# Altium footprint library THD Passive Components.PcbLib: 72 footprints (part 1 of 5)
Each footprint in its own frame and in the unit in brackets; x right, y up, seen from the top. Pads: shape width x height; smd on the part's side, far side on the other; paste and mask are expansions set on the pad; w line width, h text height; cw(c..) or ccw(c..) is an arc to the next point about the centre after c.
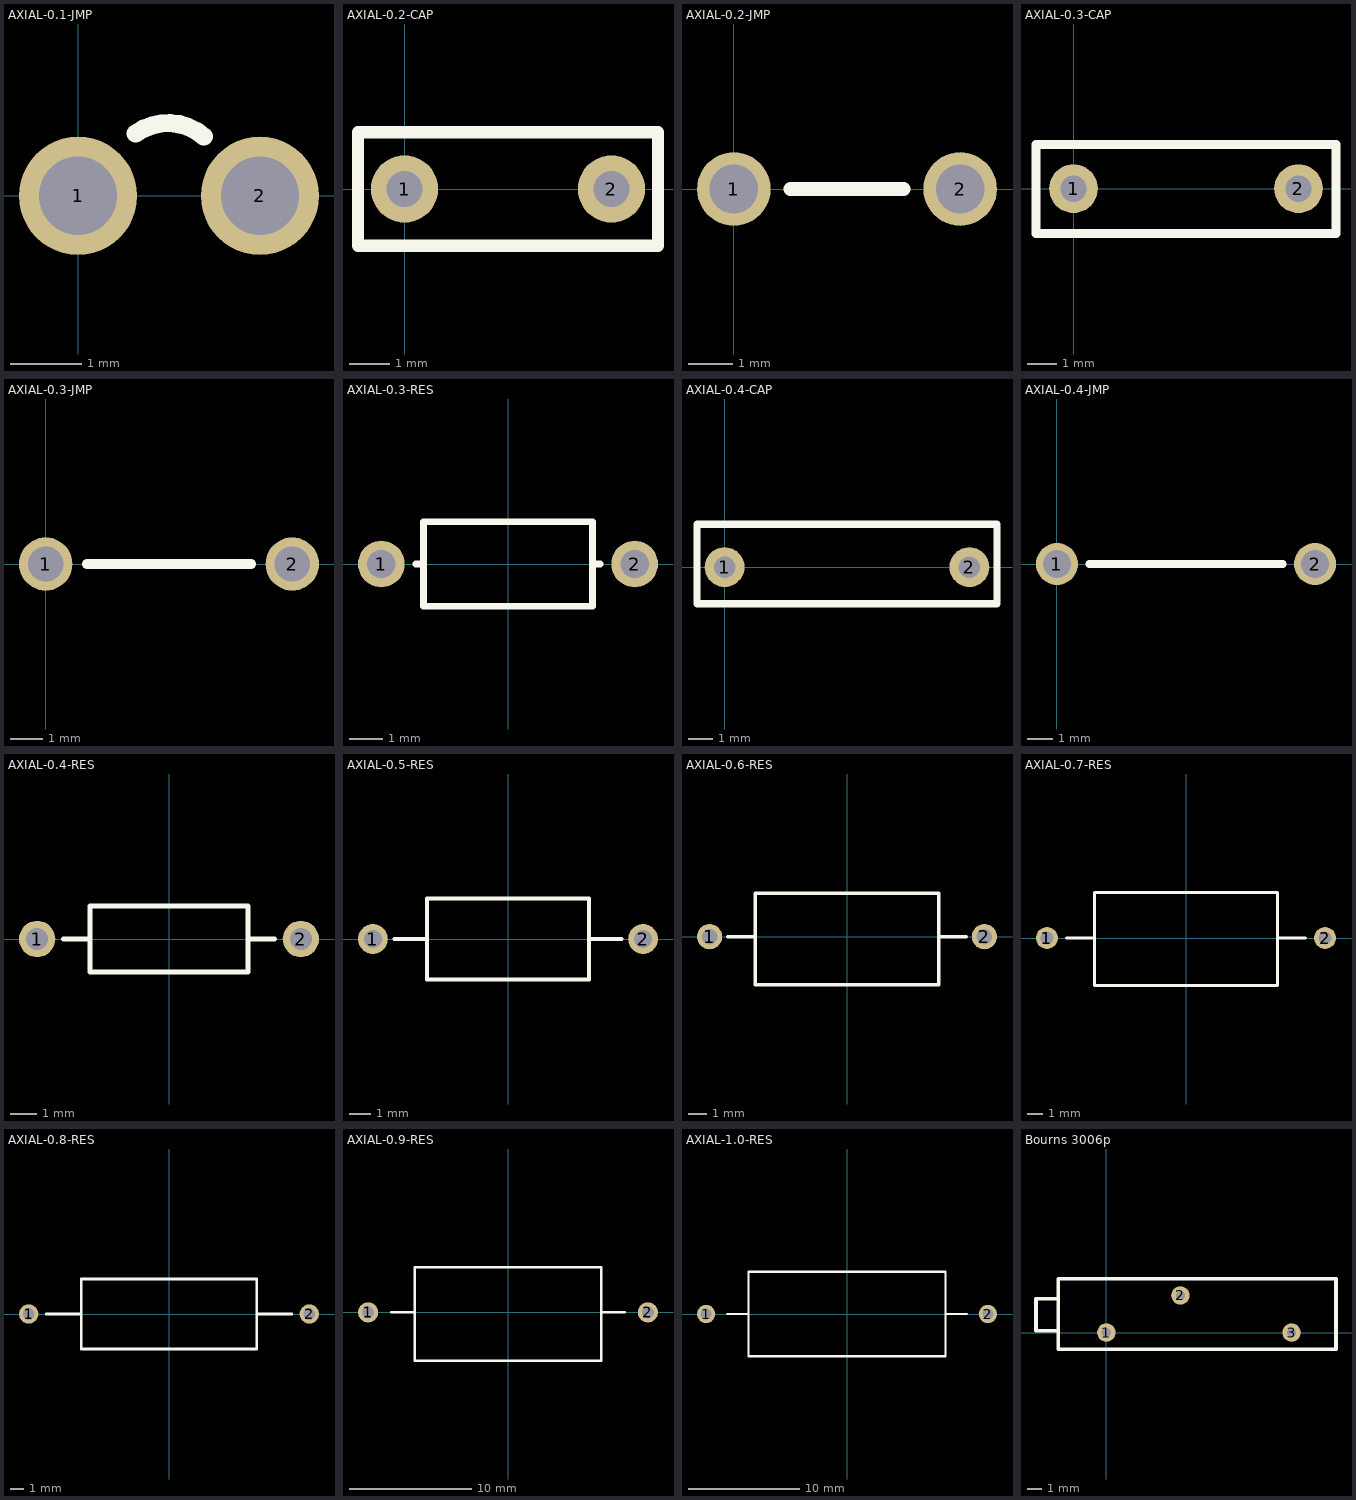
[diagram p0: the footprints below, top view; thin cyan lines are the x and y axes]

## AXIAL-0.1-JMP [mil]
pads (2):
  round 65 hole 43: 1(0,0) 2(100,0)
Top Overlay:
  lines w10: 31.56,34.22 cw(c49.36,9.73) 69.14,32.66
3D body "Jumper-100mil.STEP": height 84.49, standoff -285.33, extent -20.33,-19.68 118.82,19.69

## AXIAL-0.2-CAP [mil]
pads (2):
  round 65 hole 35: 1(0,0) 2(200,0)
Top Overlay:
  lines w12: -45,-55 245,-55 245,55 -45,55 -45,-37.5 -45,-55
3D body "THD Cap Axial P5.08mm YEL.STEP": height 105.45, standoff -95.56, extent -12.5,-52 212.5,50

## AXIAL-0.2-JMP [mil]
pads (2):
  round 65 hole 43: 1(0,0) 2(200,0)
Top Overlay:
  lines w12: 50,0 150,0
3D body "Jumper-200mil.STEP": height 84.77, standoff -285.75, extent -20.63,-19.68 218.71,19.69

## AXIAL-0.3-CAP [mil]
pads (2):
  round 65 hole 35: 1(0,0) 2(300,0)
Top Overlay:
  lines w12: -50,-60 350,-60 350,59.06 -50,59.06 -50,-60
3D body "THD Cap Axial P7.62mm YEL.STEP": height 105.05, standoff -95.96, extent -12.5,-52 312.5,50

## AXIAL-0.3-JMP [mil]
pads (2):
  round 65 hole 43: 1(0,0) 2(300,0)
Top Overlay:
  lines w12: 50,0 250,0
3D body "Jumper-300mil.STEP": height 84.77, standoff -285.24, extent -19.28,-20 319.28,19.37

## AXIAL-0.3-RES [mm] "Axial Device, Thru-Hole; 2 Leads; 0.3 in Pin Spacing"
height 1.524
pads (2):
  round 1.4 hole 0.85: 1(-3.81,0) 2(3.81,0)
Top Overlay:
  lines w0.2: -2.769,0 -2.54,0 ; 2.769,0 2.54,0 ; 2.54,0 2.54,1.27 -2.54,1.27 -2.54,-1.27 2.54,-1.27 2.54,0
3D body "THD_Axial-0.3_0.25W.STEP": height 2.73, standoff -1.47, extent -4.11,-1.204 4.11,1.204

## AXIAL-0.4-CAP [mil]
pads (2):
  round 65 hole 35: 1(0,0) 2(400,0)
Top Overlay:
  lines w12: -45,-60 -45,70 445,70 445,-60 -45,-60
3D body "THD Cap Axial P10.1mm YEL.STEP": height 137.21, standoff -170.62, extent -10.04,-58.36 410.04,68.36

## AXIAL-0.4-JMP [mil]
pads (2):
  round 65 hole 43: 1(0,0) 2(400,0)
Top Overlay:
  lines w12: 50,0 350,0
3D body "Jumper-400mil.STEP": height 84.45, standoff -285.24, extent -19.69,-19.37 419.69,20

## AXIAL-0.4-RES [mm] "Axial Device, Thru-Hole; 2 Leads; 0.4 in Pin Spacing"
height 2.032
pads (2):
  round 1.4 hole 0.85: 1(-5.08,0) 2(5.08,0)
Top Overlay:
  lines w0.2: -4.064,0 -3.048,0 ; 3.048,0 4.064,0 ; -3.048,-1.27 -3.048,1.27 3.048,1.27 3.048,-1.27 -3.048,-1.27
3D body "THD_Axial-0.4_0_25W.STEP": height 2.73, standoff -1.47, extent -5.38,-1.202 5.38,1.202

## AXIAL-0.5-RES [mm] "Axial Device, Thru-Hole; 2 Leads; 0.5 in Pin Spacing"
height 2.54
pads (2):
  round 1.4 hole 0.85: 1(-6.35,0) 2(6.35,0)
Top Overlay:
  lines w0.2: -5.334,0 -3.81,0 ; 3.81,0 5.334,0 ; -3.81,-1.905 -3.81,1.905 3.81,1.905 3.81,-1.905 1.27,-1.905 -1.27,-1.905 -3.81,-1.905
3D body "THD_Axial-0.5_0_5W.STEP": height 5.06, standoff -2.3, extent -6.725,-1.845 6.725,1.905

## AXIAL-0.6-RES [mm] "Axial Device, Thru-Hole; 2 Leads; 0.6 in Pin Spacing"
height 2.54
pads (2):
  round 1.4 hole 0.85: 1(-7.62,0) 2(7.62,0)
Top Overlay:
  lines w0.2: -6.604,0 -5.08,0 ; 5.08,0 6.604,0 ; -5.08,-2.667 -5.08,2.413 5.08,2.413 5.08,-2.667 -5.08,-2.667
3D body "THD_Axial-0.6_1W.STEP": height 5.51, standoff -2.49, extent -7.97,-2.587 7.97,2.413

## AXIAL-0.7-RES [mm] "Axial Device, Thru-Hole; 2 Leads; 0.7 in Pin Spacing"
height 4.064
pads (2):
  round 1.4 hole 0.85: 1(-8.89,0) 2(8.89,0)
Top Overlay:
  lines w0.2: -7.62,0 -5.842,0 ; 5.842,0 7.62,0 ; -5.842,-3.048 5.842,-3.048 5.842,2.921 -5.842,2.921 -5.842,-3.048
3D body "THD_Axial-0.7_0_5W.STEP": height 9.23, standoff -1.27, extent -9.29,-3.071 9.29,2.921

## AXIAL-0.8-RES [mm] "Axial Device, Thru-Hole; 2 Leads; 0.8 in Pin Spacing"
height 4.064
pads (2):
  round 1.4 hole 0.85: 1(-10.16,0) 2(10.16,0)
Top Overlay:
  lines w0.2: -8.89,0 -6.35,0 ; 6.35,0 8.89,0 ; -6.35,-2.54 6.35,-2.54 6.35,2.54 -6.35,2.54 -6.35,-2.54
3D body "THD_Axial-0.8_3W.STEP": height 5.8, standoff -3.27, extent -10.56,-2.46 10.56,2.54

## AXIAL-0.9-RES [mm] "Axial Device, Thru-Hole; 2 Leads; 0.9 in Pin Spacing"
height 5.08
pads (2):
  round 1.65 hole 1: 1(-11.43,0) 2(11.43,0)
Top Overlay:
  lines w0.2: -9.525,0 -7.62,0 ; 7.62,0 9.525,0 ; -7.62,-3.937 -7.62,3.683 7.62,3.683 7.62,-3.937 -7.62,-3.937
3D body "THD_Axial-0.9_0_5W.STEP": height 8.64, standoff -3.11, extent -11.824,-3.937 11.824,3.683

## AXIAL-1.0-RES [mm] "Axial Device, Thru-Hole; 2 Leads; 1.0 in Pin Spacing"
height 7.62
pads (2):
  round 1.65 hole 1: 1(-12.7,0) 2(12.7,0)
Top Overlay:
  lines w0.2: -10.795,0 -8.89,0 ; 8.89,0 10.795,0 ; -8.89,-3.81 -8.89,3.81 8.89,3.81 8.89,-3.81 -8.89,-3.81
3D body "THD_Axial-1.0_5W.STEP": height 7.62, standoff -4.14, extent -13.208,-3.81 13.216,3.81

## Bourns 3006p [mm]
pads (3):
  round 1.27 hole 0.635: 1(0,0) 2(5.08,2.54) 3(12.7,0)
Top Overlay:
  lines w0.254: -3.302,0.127 -4.826,0.127 -4.826,2.311 -3.302,2.311 ; -3.302,-1.143 15.748,-1.143 15.748,3.683 -3.302,3.683 -3.302,-1.143
3D body "3006p.STEP": height 6.73, standoff -4.8, extent -4.826,-1.143 15.748,3.683